# Altium footprint library DBLib.PcbLib: 92 footprints (part 4 of 6)
Each footprint in its own frame and in the unit in brackets; x right, y up, seen from the top. Pads: shape width x height; smd on the part's side, far side on the other; paste and mask are expansions set on the pad; w line width, h text height; cw(c..) or ccw(c..) is an arc to the next point about the centre after c.
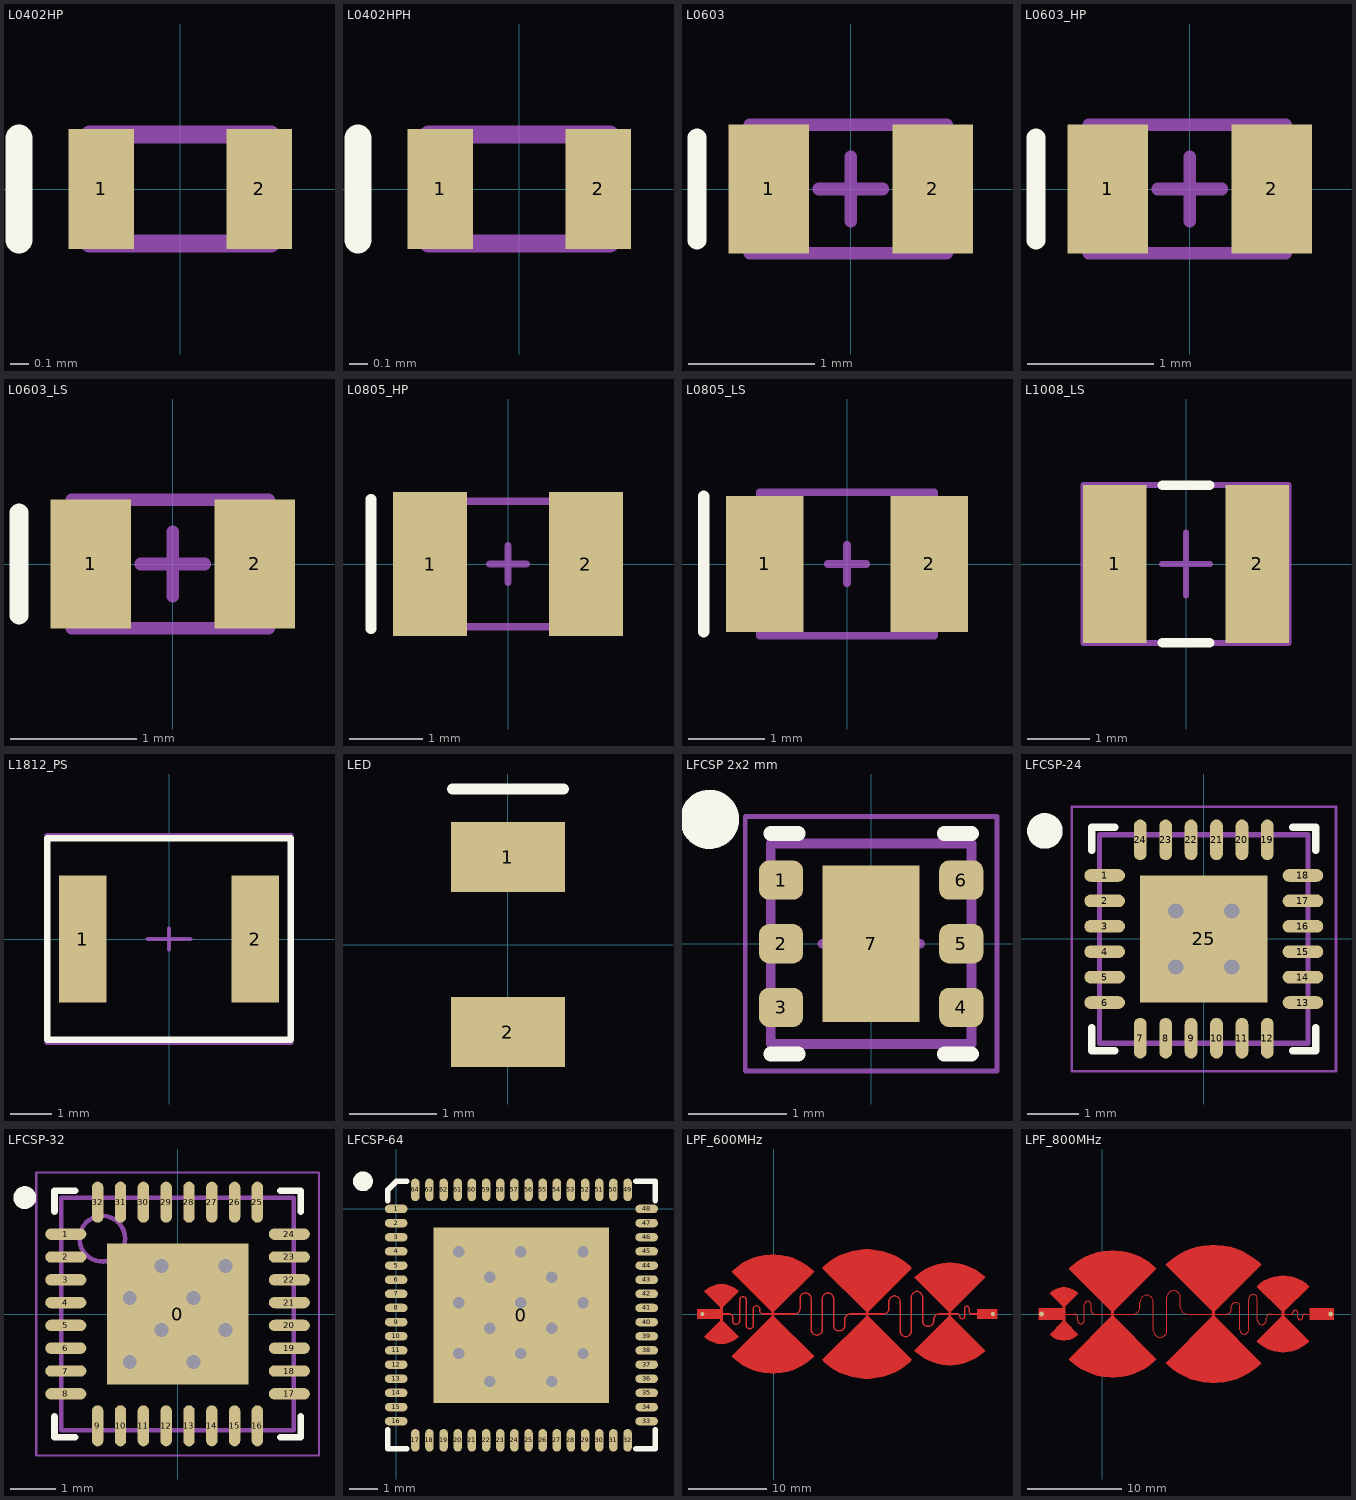
[diagram p3: the footprints below, top view; thin cyan lines are the x and y axes]

## L0402HP [mm]
height 1.3
pads (2):
  rect 0.36x0.66 smd: 1(-0.435,0) 2(0.435,0)
Top Overlay:
  lines w0.15: -0.889,-0.279 -0.889,0.279
Mechanical 1:
  lines w0.1: -0.5,-0.3 0.5,-0.3 0.5,0.3 -0.5,0.3 -0.5,-0.3
3D body "Ind_Coilcraft_0402HP-22NXGLU_eec.STEP": height 0.61, standoff 0, extent -0.546,-0.305 0.546,0.305

## L0402HPH [mm]
height 1.3
pads (2):
  rect 0.36x0.66 smd: 1(-0.435,0) 2(0.435,0)
Top Overlay:
  lines w0.15: -0.889,-0.279 -0.889,0.279
Mechanical 1:
  lines w0.1: -0.5,-0.3 -0.5,0.3 0.5,0.3 0.5,-0.3 -0.5,-0.3
3D body "Ind_Coilcraft_0402HPH-R10XJLU_eec.STEP": height 0.6, standoff -0.01, extent -0.56,-0.325 0.56,0.335

## L0603 [mm]
height 1.3
pads (2):
  rect 0.64x1.02 smd: 1(-0.65,0) 2(0.65,0)
Top Overlay:
  lines w0.15: -1.219,-0.406 -1.219,0.406
Mechanical 1:
  lines w0.1: -0.254,0 0.254,0 ; 0,-0.254 0,0.254 ; -0.8,-0.508 -0.8,0.508 0.762,0.508 0.762,-0.508 -0.8,-0.508
3D body "User Library-SLF_0603.step": height 1, standoff -0.02, extent -0.9,-0.56 0.9,0.56

## L0603_HP [mm]
height 1.3
pads (2):
  rect 0.64x1.02 smd: 1(-0.65,0) 2(0.65,0)
Top Overlay:
  lines w0.15: -1.219,-0.406 -1.219,0.406
Mechanical 1:
  lines w0.1: -0.254,0 0.254,0 ; 0,-0.254 0,0.254 ; -0.8,-0.508 -0.8,0.508 0.762,0.508 0.762,-0.508 -0.8,-0.508
3D body "Coilcraft-0603HP.step": height 0.93, standoff -0.01, extent -0.875,-0.545 0.875,0.545

## L0603_LS [mm]
height 1.3
pads (2):
  rect 0.64x1.02 smd: 1(-0.65,0) 2(0.65,0)
Top Overlay:
  lines w0.15: -1.219,-0.406 -1.219,0.406
Mechanical 1:
  lines w0.1: -0.254,0 0.254,0 ; 0,-0.254 0,0.254 ; -0.8,-0.508 0.762,-0.508 0.762,0.508 -0.8,0.508 -0.8,-0.508
3D body "Coilcraft-0603LS.step": height 1.11, standoff -0.01, extent -0.901,-0.584 0.901,0.585

## L0805_HP [mm]
height 1.3
pads (2):
  rect 1.02x1.98 smd: 1(-1.07,0) 2(1.07,0)
Top Overlay:
  lines w0.15: -1.88,-0.889 -1.88,0.889
Mechanical 1:
  lines w0.1: -0.254,0 0.254,0 ; 0,-0.254 0,0.254 ; -1.145,-0.862 -1.145,0.863 1.144,0.863 1.144,-0.862 -1.145,-0.862
3D body "Coilcraft-0805CS.step": height 1.51, standoff -0.01, extent -1.145,-0.862 1.144,0.863

## L0805_LS [mm]
height 1.3
pads (2):
  rect 1.02x1.78 smd: 1(-1.08,0) 2(1.08,0)
Top Overlay:
  lines w0.15: -1.88,-0.889 -1.88,0.889
Mechanical 1:
  lines w0.1: -0.254,0 0.254,0 ; 0,-0.254 0,0.254 ; -1.145,-0.94 -1.145,0.94 1.144,0.94 1.144,-0.94 -1.145,-0.94
3D body "Coilcraft-0805LS.step": height 1.59, standoff -0.01, extent -1.145,-0.955 1.145,0.955

## L1008_LS [mm]
height 1.3
pads (2):
  rect 1.02x2.54 smd: 1(-1.145,0) 2(1.145,0)
Top Overlay:
  lines w0.15: -0.381,-1.27 0.381,-1.27 ; -0.381,1.27 0.381,1.27
Mechanical 1:
  lines w0.1: -0.381,0 0.381,0 ; 0,-0.508 0,0.508 ; -1.651,-1.27 -1.651,1.27 1.651,1.27 1.651,-1.27 -1.651,-1.27
3D body "Coilcraft-1008LS.step": height 2.02, standoff -0.01, extent -1.46,-1.395 1.46,1.395

## L1812_PS [mm]
height 1.3
pads (2):
  rect 1.14x3.05 smd: 1(-2.07,0) 2(2.07,0)
Top Overlay:
  lines w0.15: -2.921,-2.413 -2.921,2.413 2.921,2.413 2.921,-2.413 -2.921,-2.413
Mechanical 1:
  lines w0.1: -0.508,0 0.508,0 ; 0,-0.254 0,0.254 ; -2.93,-2.49 -2.93,2.49 2.93,2.49 2.93,-2.49 -2.93,-2.49
3D body "Coilcraft-1812PS.step": height 3.8, standoff -0.01, extent -2.93,-2.49 2.93,2.49

## LED [mm] "2012"
pads (2):
  rect 1.3x0.8 smd: 1(0,1) 2(0,-1)
Top Overlay:
  lines w0.127: -0.635,1.778 0.635,1.778
3D body "APHCM2012.STEP": height 0.4, standoff -0.01, extent -0.625,-1 0.625,1

## LFCSP 2x2 mm [mm] "LFCSP, 6-Leads, Body 2,00x2,00mm, Pitch 0,65mm, Thermal Pad 1,60x0,99mm, IPC Medium Density"
height 0.9
pads (7):
  rrect50% 0.45x0.4 smd: 1(-0.92,0.65) 2(-0.92,0) 3(-0.92,-0.65) 4(0.92,-0.65) 5(0.92,0) 6(0.92,0.65)
  rect 0.99x1.6 smd: 7(0,0)
Top Overlay:
  circle w0.35: c-1.651,1.27 r0.127
  lines w0.15: -1.025,-1.125 -0.745,-1.125 ; -1.025,1.125 -0.745,1.125 ; 0.745,-1.125 1.025,-1.125 ; 0.745,1.125 1.025,1.125
Mechanical 1:
  lines w0.05: -1.285,-1.3 -1.285,1.3 1.285,1.3 1.285,-1.3 -1.285,-1.3
  lines w0.1: -0.5,0 0.5,0 ; 0,-0.5 0,0.5 ; -1.025,-1.025 -1.025,1.025 1.025,1.025 1.025,-1.025 -1.025,-1.025
3D body "User Library-LFCSP_UD6.step": height 0.65, standoff 0, extent -1.05,-1.005 1.05,0.995

## LFCSP-24 [mm] "QFN, 24-Leads, Body 4,00x4,00mm, Pitch 0,50mm, Thermal Pad 2,50x2,50mm, IPC Medium Density"
height 0.8
pads (25):
  oval 0.8x0.25 smd: 1(-1.95,1.25) 2(-1.95,0.75) 3(-1.95,0.25) 4(-1.95,-0.25) 5(-1.95,-0.75) 6(-1.95,-1.25) 13(1.95,-1.25) 14(1.95,-0.75) 15(1.95,-0.25) 16(1.95,0.25) 17(1.95,0.75) 18(1.95,1.25)
  oval 0.25x0.8 smd: 7(-1.25,-1.95) 8(-0.75,-1.95) 9(-0.25,-1.95) 10(0.25,-1.95) 11(0.75,-1.95) 12(1.25,-1.95) 19(1.25,1.95) 20(0.75,1.95) 21(0.25,1.95) 22(-0.25,1.95) 23(-0.75,1.95) 24(-1.25,1.95)
  rect 2.5x2.5 all layers, no hole: 25(0,0)
via -0.55,0.55 diameter 0.6 hole 0.3
via 0.55,0.55 diameter 0.6 hole 0.3
via 0.55,-0.55 diameter 0.6 hole 0.3
via -0.55,-0.55 diameter 0.6 hole 0.3
Top Overlay:
  circle w0.35: c-3.125,2.125 r0.175
  lines w0.15: -2.2,-1.75 -2.2,-2.2 -1.75,-2.2 ; -2.2,1.75 -2.2,2.2 -1.75,2.2 ; 1.75,-2.2 2.2,-2.2 2.2,-1.75 ; 1.75,2.2 2.2,2.2 2.2,1.75
Mechanical 1:
  lines w0.05: -2.6,-2.6 -2.6,2.6 2.6,2.6 2.6,-2.6 -2.6,-2.6
  lines w0.1: -2.05,-2.05 -2.05,2.05 2.05,2.05 2.05,-2.05 -2.05,-2.05
Mechanical 15:
  lines w0.1: -0.5,0 0.5,0 ; 0,-0.5 0,0.5
3D body "User Library-LFCSP-24.step": height 0.83, standoff -0.02, extent -1.99,-2.01 2.01,1.99

## LFCSP-32 [mm] "LFCSP, 32-Leads, Body 5,00x5,00mm, Pitch 0,50mm"
height 1.35
pads (33):
  rect 3.1x3.1 all layers, no hole: 0(0,0)
  oval 0.9x0.25 smd: 1(-2.45,1.75) 2(-2.45,1.25) 3(-2.45,0.75) 4(-2.45,0.25) 5(-2.45,-0.25) 6(-2.45,-0.75) 7(-2.45,-1.25) 8(-2.45,-1.75) 17(2.45,-1.75) 18(2.45,-1.25) 19(2.45,-0.75) 20(2.45,-0.25) 21(2.45,0.25) 22(2.45,0.75) 23(2.45,1.25) 24(2.45,1.75)
  oval 0.25x0.9 smd: 9(-1.75,-2.45) 10(-1.25,-2.45) 11(-0.75,-2.45) 12(-0.25,-2.45) 13(0.25,-2.45) 14(0.75,-2.45) 15(1.25,-2.45) 16(1.75,-2.45) 25(1.75,2.45) 26(1.25,2.45) 27(0.75,2.45) 28(0.25,2.45) 29(-0.25,2.45) 30(-0.75,2.45) 31(-1.25,2.45) 32(-1.75,2.45)
via -1.05,0.35 diameter 0.6 hole 0.3
via 0.35,-1.05 diameter 0.6 hole 0.3
via 1.05,-0.35 diameter 0.6 hole 0.3
via -0.35,-0.35 diameter 0.6 hole 0.3
via 0.35,0.35 diameter 0.6 hole 0.3
via 1.05,1.05 diameter 0.6 hole 0.3
via -0.35,1.05 diameter 0.6 hole 0.3
via -1.05,-1.05 diameter 0.6 hole 0.3
Top Overlay:
  circle w0.25: c-3.35,2.55 r0.125
  lines w0.15: -2.7,-2.25 -2.7,-2.7 -2.25,-2.7 ; -2.7,2.25 -2.7,2.7 -2.25,2.7 ; 2.25,-2.7 2.7,-2.7 2.7,-2.25 ; 2.25,2.7 2.7,2.7 2.7,2.25
Mechanical 1:
  circle w0.1: c-1.65,1.65 r0.5
  lines w0.05: -3.1,-3.1 -3.1,3.1 3.1,3.1 3.1,-3.1 -3.1,-3.1
  lines w0.1: -0.5,0 0.5,0 ; 0,-0.5 0,0.5 ; -2.55,-2.55 -2.55,2.55 2.55,2.55 2.55,-2.55 -2.55,-2.55

## LFCSP-64 [mm]
height 1
pads (65):
  rect 6.2x6.2 all layers, no hole: 0(4.425,-3.75)
  oval 0.8x0.3 smd: 1(0,0) 2(0,-0.5) 3(0,-1) 4(0,-1.5) 5(0,-2) 6(0,-2.5) 7(0,-3) 8(0,-3.5) 9(0,-4) 10(0,-4.5) 11(0,-5) 12(0,-5.5) 13(0,-6) 14(0,-6.5) 15(0,-7) 16(0,-7.5) 33(8.85,-7.5) 34(8.85,-7) 35(8.85,-6.5) 36(8.85,-6) 37(8.85,-5.5) 38(8.85,-5) 39(8.85,-4.5) 40(8.85,-4) 41(8.85,-3.5) 42(8.85,-3) 43(8.85,-2.5) 44(8.85,-2) 45(8.85,-1.5) 46(8.85,-1) 47(8.85,-0.5) 48(8.85,0)
  oval 0.3x0.8 smd: 17(0.675,-8.175) 18(1.175,-8.175) 19(1.675,-8.175) 20(2.175,-8.175) 21(2.675,-8.175) 22(3.175,-8.175) 23(3.675,-8.175) 24(4.175,-8.175) 25(4.675,-8.175) 26(5.175,-8.175) 27(5.675,-8.175) 28(6.175,-8.175) 29(6.675,-8.175) 30(7.175,-8.175) 31(7.675,-8.175) 32(8.175,-8.175) 49(8.175,0.675) 50(7.675,0.675) 51(7.175,0.675) 52(6.675,0.675) 53(6.175,0.675) 54(5.675,0.675) 55(5.175,0.675) 56(4.675,0.675) 57(4.175,0.675) 58(3.675,0.675) 59(3.175,0.675) 60(2.675,0.675) 61(2.175,0.675) 62(1.675,0.675) 63(1.175,0.675) 64(0.675,0.675)
via 2.211,-5.111 diameter 0.7 hole 0.4
via 4.4,-1.511 diameter 0.7 hole 0.4
via 6.6,-1.511 diameter 0.7 hole 0.4
via 3.3,-2.411 diameter 0.7 hole 0.4
via 5.5,-2.411 diameter 0.7 hole 0.4
via 4.4,-3.311 diameter 0.7 hole 0.4
via 6.6,-3.311 diameter 0.7 hole 0.4
via 3.3,-4.211 diameter 0.7 hole 0.4
via 5.5,-4.211 diameter 0.7 hole 0.4
via 4.4,-5.111 diameter 0.7 hole 0.4
via 6.6,-5.111 diameter 0.7 hole 0.4
via 2.211,-3.311 diameter 0.7 hole 0.4
via 2.211,-1.511 diameter 0.7 hole 0.4
via 5.5,-6.1 diameter 0.7 hole 0.4
via 3.3,-6.1 diameter 0.7 hole 0.4
Top Overlay:
  circle w0.35: c-1.175,0.975 r0.175
  lines w0.2: -0.3,-7.8 -0.3,-8.475 0.375,-8.475 ; -0.3,0.3 -0.3,0.675 0,0.975 0.375,0.975 ; 8.475,-8.475 9.15,-8.475 9.15,-7.8 ; 8.475,0.975 9.15,0.975 9.15,0.3
Top Paste:
  rectangle: 4.6,-6.5 7.1,-3.9
  rectangle: 4.6,-3.6 7.1,-1
  rectangle: 1.7,-3.6 4.3,-1
  rectangle: 1.7,-6.5 4.3,-3.9
3D body "User Library-LFCSP-64 AD9984AKCPZ-170.step": height 0.82, standoff -0.05, extent -0.075,-8.25 8.925,0.75

## LPF_600MHz [mm] "stripline LPF"
pads (2):
  round 0.5 smd: IN(-9.144,0) OUT(27.94,0)
Top Layer:
  region: 24.009,-0.677 23.934,-0.677 23.795,-0.62 23.689,-0.514 23.631,-0.375 23.631,-0.3 23.627,-0.254 23.592,-0.169 23.526,-0.104 23.441,-0.068 23.395,-0.064 22.597,-0.064 22.571,-0.064 22.534,-0.026 22.534,0.026 22.571,0.064 22.597,0.064 23.395,0.064 23.468,0.064 23.601,0.009 23.704,-0.094 23.759,-0.228 23.759,-0.3 23.764,-0.349 23.801,-0.439 23.87,-0.507 23.96,-0.545 24.009,-0.549 24.057,-0.545 24.147,-0.507 24.216,-0.439 24.254,-0.349 24.258,-0.3 24.258,0.658 24.258,0.733 24.316,0.871 24.422,0.978 24.561,1.035 24.636,1.035 24.711,1.035 24.849,0.978 24.956,0.871 25.013,0.733 25.013,0.658 25.013,0.313 25.018,0.265 25.055,0.175 25.124,0.106 25.214,0.069 25.263,0.064 25.93,0.064 25.942,0.064 25.966,0.054 25.984,0.036 25.994,0.013 25.994,0 25.994,-0.013 25.984,-0.036 25.966,-0.054 25.942,-0.064 25.93,-0.064 25.263,-0.064 25.188,-0.064 25.049,-0.006 24.943,0.1 24.885,0.238 24.885,0.313 24.885,0.658 24.881,0.706 24.843,0.796 24.774,0.865 24.684,0.903 24.636,0.907 24.587,0.903 24.497,0.865 24.428,0.796 24.391,0.706 24.386,0.658 24.386,-0.3 24.386,-0.375 24.329,-0.514 24.222,-0.62 24.084,-0.677
  region: 151 vertices and 0 holes, not listed, extent -6.629,-1.964 -0.204,2.262
  region: 191 vertices and 0 holes, not listed, extent 11.955,-2.954 22.394,2.954
  region: 191 vertices and 0 holes, not listed, extent -0.064,-2.757 11.815,2.757
  region: 11.758,-0.27 11.757,-0.27 11.754,-0.269 11.752,-0.267 11.751,-0.265 11.751,-0.263 11.751,0.263 11.751,0.265 11.752,0.267 11.754,0.269 11.757,0.27 11.758,0.27 12.012,0.27 12.013,0.27 12.016,0.269 12.018,0.267 12.019,0.265 12.019,0.263 12.019,-0.263 12.019,-0.265 12.018,-0.267 12.016,-0.269 12.013,-0.27 12.012,-0.27
  region: -0.261,-0.27 -0.262,-0.27 -0.265,-0.269 -0.266,-0.267 -0.267,-0.265 -0.267,-0.263 -0.267,0.263 -0.267,0.265 -0.266,0.267 -0.265,0.269 -0.262,0.27 -0.261,0.27 -0.007,0.27 -0.005,0.27 -0.003,0.269 -0.001,0.267 0,0.265 0,0.263 0,-0.263 0,-0.265 -0.001,-0.267 -0.003,-0.269 -0.005,-0.27 -0.007,-0.27
  region: -6.826,-0.797 -6.827,-0.797 -6.83,-0.796 -6.831,-0.794 -6.833,-0.792 -6.833,-0.79 -6.833,0.79 -6.833,0.792 -6.831,0.794 -6.83,0.796 -6.827,0.797 -6.826,0.797 -6.572,0.797 -6.57,0.797 -6.568,0.796 -6.566,0.794 -6.565,0.792 -6.565,0.79 -6.565,-0.79 -6.565,-0.792 -6.566,-0.794 -6.568,-0.796 -6.57,-0.797 -6.572,-0.797
  region: 22.337,-0.27 22.335,-0.27 22.333,-0.269 22.331,-0.267 22.33,-0.265 22.33,-0.263 22.33,0.263 22.33,0.265 22.331,0.267 22.333,0.269 22.335,0.27 22.337,0.27 22.591,0.27 22.592,0.27 22.595,0.269 22.596,0.267 22.597,0.265 22.597,0.263 22.597,-0.263 22.597,-0.265 22.596,-0.267 22.595,-0.269 22.592,-0.27 22.591,-0.27
  region: -0.261,0.263 -5.395,5.397 -5.136,5.656 -4.571,6.12 -3.963,6.526 -3.319,6.87 -2.643,7.15 -1.944,7.362 -1.227,7.505 -0.499,7.577 -0.134,7.577 0.232,7.577 0.959,7.505 1.676,7.362 2.376,7.15 3.051,6.87 3.696,6.526 4.304,6.12 4.869,5.656 5.127,5.397 -0.007,0.263
  region: -5.395,-5.397 -5.136,-5.656 -4.571,-6.12 -3.963,-6.526 -3.319,-6.87 -2.643,-7.15 -1.944,-7.362 -1.227,-7.505 -0.499,-7.577 -0.134,-7.577 0.232,-7.577 0.959,-7.505 1.676,-7.362 2.376,-7.15 3.051,-6.87 3.696,-6.526 4.304,-6.12 4.869,-5.656 5.127,-5.397 -0.007,-0.263 -0.261,-0.263
  region: -6.826,0.79 -8.917,2.882 -8.808,2.991 -8.57,3.187 -8.314,3.358 -8.042,3.503 -7.757,3.621 -7.462,3.711 -7.16,3.771 -6.853,3.801 -6.699,3.801 -6.545,3.801 -6.238,3.771 -5.936,3.711 -5.641,3.621 -5.356,3.503 -5.084,3.358 -4.827,3.187 -4.589,2.991 -4.48,2.882 -6.572,0.79
  region: -8.917,-2.882 -8.808,-2.991 -8.57,-3.187 -8.314,-3.358 -8.042,-3.503 -7.757,-3.621 -7.462,-3.711 -7.16,-3.771 -6.853,-3.801 -6.699,-3.801 -6.545,-3.801 -6.238,-3.771 -5.936,-3.711 -5.641,-3.621 -5.356,-3.503 -5.084,-3.358 -4.827,-3.187 -4.589,-2.991 -4.48,-2.882 -6.572,-0.79 -6.826,-0.79
  region: 11.758,0.263 6.151,5.871 6.432,6.152 7.048,6.658 7.711,7.1 8.414,7.476 9.15,7.781 9.912,8.012 10.694,8.168 11.487,8.246 11.885,8.246 12.283,8.246 13.076,8.168 13.858,8.012 14.62,7.781 15.356,7.476 16.059,7.1 16.721,6.658 17.337,6.152 17.619,5.871 12.012,0.263
  region: 6.151,-5.871 6.432,-6.152 7.048,-6.658 7.711,-7.1 8.414,-7.476 9.15,-7.781 9.912,-8.012 10.694,-8.168 11.487,-8.246 11.885,-8.246 12.283,-8.246 13.076,-8.168 13.858,-8.012 14.62,-7.781 15.356,-7.476 16.059,-7.1 16.721,-6.658 17.337,-6.152 17.619,-5.871 12.012,-0.263 11.758,-0.263
  region: 17.937,-4.663 18.16,-4.885 18.646,-5.284 19.169,-5.634 19.724,-5.93 20.305,-6.171 20.906,-6.353 21.523,-6.476 22.149,-6.538 22.464,-6.538 22.778,-6.538 23.404,-6.476 24.021,-6.353 24.623,-6.171 25.204,-5.93 25.759,-5.634 26.282,-5.284 26.768,-4.885 26.99,-4.663 22.591,-0.263 22.337,-0.263
  region: 22.337,0.263 17.937,4.663 18.16,4.885 18.646,5.284 19.169,5.634 19.724,5.93 20.305,6.171 20.906,6.353 21.523,6.476 22.149,6.538 22.464,6.538 22.778,6.538 23.404,6.476 24.021,6.353 24.623,6.171 25.204,5.93 25.759,5.634 26.282,5.284 26.768,4.885 26.99,4.663 22.591,0.263
  region: -9.826,-0.59 -6.826,-0.59 -6.826,0.59 -9.826,0.59
  region: 25.93,-0.59 25.93,0.59 28.47,0.59 28.47,-0.59
Top Solder:
  region: -8.89,8.89 27.305,8.89 27.431,8.89 27.665,8.793 27.843,8.615 27.94,8.381 27.94,8.255 27.94,-8.255 27.94,-8.381 27.843,-8.615 27.665,-8.793 27.431,-8.89 27.305,-8.89 -8.89,-8.89 -9.016,-8.89 -9.25,-8.793 -9.428,-8.615 -9.525,-8.381 -9.525,-8.255 -9.525,8.255 -9.525,8.381 -9.428,8.615 -9.25,8.793 -9.016,8.89

## LPF_800MHz [mm] "stripline LPF"
pads (2):
  round 0.5 smd: IN(-6.4,0) OUT(24.2,0)
Top Layer:
  region: 0.995,0.268 -3.524,4.787 -3.296,5.015 -2.797,5.425 -2.26,5.783 -1.691,6.088 -1.094,6.335 -0.476,6.522 0.157,6.648 0.799,6.711 1.122,6.711 1.445,6.711 2.087,6.648 2.72,6.522 3.338,6.335 3.934,6.088 4.504,5.783 5.04,5.425 5.539,5.015 5.767,4.787 1.249,0.268
  region: -5.543,-2.17 -5.394,-2.319 -5.044,-2.552 -4.655,-2.714 -4.242,-2.796 -4.032,-2.796 -3.822,-2.796 -3.409,-2.714 -3.02,-2.552 -2.67,-2.319 -2.521,-2.17 -3.905,-0.786 -4.159,-0.786
  region: -4.159,0.795 -5.543,2.18 -5.394,2.328 -5.044,2.562 -4.655,2.723 -4.242,2.806 -4.032,2.806 -3.822,2.806 -3.409,2.723 -3.02,2.562 -2.67,2.328 -2.521,2.18 -3.905,0.795
  region: -4.159,-0.786 -3.905,-0.786 -3.905,0.795 -4.159,0.795
  region: -6.699,-0.586 -6.699,0.595 -4.159,0.595 -4.159,-0.586
  region: 0.995,-0.259 0.995,0.268 1.249,0.268 1.249,-0.259
  region: -3.524,-4.777 -3.296,-5.005 -2.797,-5.415 -2.26,-5.774 -1.691,-6.078 -1.094,-6.325 -0.476,-6.512 0.157,-6.638 0.799,-6.702 1.122,-6.702 1.445,-6.702 2.087,-6.638 2.72,-6.512 3.338,-6.325 3.934,-6.078 4.504,-5.774 5.04,-5.415 5.539,-5.005 5.767,-4.777 1.249,-0.259 0.995,-0.259
  region: 6.756,5.203 11.69,0.268 11.944,0.268 16.879,5.203 16.63,5.452 16.086,5.898 15.502,6.288 14.881,6.62 14.232,6.889 13.559,7.093 12.869,7.23 12.169,7.299 11.817,7.299 11.466,7.299 10.766,7.23 10.076,7.093 9.403,6.889 8.753,6.62 8.133,6.288 7.548,5.898 7.004,5.452
  region: 11.69,-0.259 11.944,-0.259 11.944,0.268 11.69,0.268
  region: 6.756,-5.193 7.004,-5.442 7.548,-5.888 8.133,-6.279 8.753,-6.61 9.403,-6.879 10.076,-7.083 10.766,-7.221 11.466,-7.29 11.817,-7.29 12.169,-7.29 12.869,-7.221 13.559,-7.083 14.232,-6.879 14.881,-6.61 15.502,-6.279 16.086,-5.888 16.63,-5.442 16.879,-5.193 11.944,-0.259 11.69,-0.259
  region: 16.393,2.906 19.03,0.268 19.284,0.268 21.922,2.906 21.786,3.042 21.489,3.286 21.17,3.499 20.831,3.68 20.476,3.827 20.109,3.939 19.732,4.014 19.349,4.051 19.157,4.051 18.965,4.051 18.583,4.014 18.206,3.939 17.839,3.827 17.484,3.68 17.145,3.499 16.825,3.286 16.528,3.042
  region: 19.03,-0.259 19.284,-0.259 19.284,0.268 19.03,0.268
  region: 16.393,-2.896 16.528,-3.032 16.825,-3.276 17.145,-3.489 17.484,-3.67 17.839,-3.818 18.206,-3.929 18.583,-4.004 18.965,-4.042 19.157,-4.042 19.349,-4.042 19.732,-4.004 20.109,-3.929 20.476,-3.818 20.831,-3.67 21.17,-3.489 21.489,-3.276 21.786,-3.032 21.922,-2.896 19.284,-0.259 19.03,-0.259
  region: 21.992,-0.586 24.532,-0.586 24.532,0.595 21.992,0.595
  lines w0.013: -3.905,-0.059 -3.905,0.068 ; 0.995,-0.059 0.995,0.068 ; 1.249,-0.059 1.249,0.068 ; 11.69,-0.059 11.69,0.068 ; 11.944,-0.059 11.944,0.068
  lines w0.127: -3.912,0 -3.683,0 -3.32,0 -2.956,0 cw(c-2.956,-0.363) -2.593,-0.363 -2.593,-0.674 ccw(c-2.229,-0.674) -2.229,-1.038 ccw(c-2.229,-0.674) -1.866,-0.674 -1.866,0 -1.866,0.978 cw(c-1.502,0.978) -1.502,1.342 cw(c-1.502,0.978) -1.139,0.978 -1.139,0.363 ccw(c-0.775,0.363) -0.775,0 0,0 0.991,0 ; 1.245,0 3.302,0 ccw(c3.302,0.713) 4.015,0.713 4.015,1.254 cw(c4.729,1.254) 4.729,1.968 cw(c4.729,1.254) 5.442,1.254 5.442,0 5.442,-1.749 ccw(c6.156,-1.749) 6.156,-2.462 ccw(c6.156,-1.749) 6.869,-1.749 6.869,0 6.869,1.749 cw(c7.583,1.749) 7.583,2.462 cw(c7.583,1.749) 8.296,1.749 8.296,0.713 ccw(c9.01,0.713) 9.01,0 10.287,0 11.69,0 ; 11.944,0 13.208,0 ccw(c13.208,0.463) 13.671,0.463 13.671,0.743 cw(c14.135,0.743) 14.135,1.206 cw(c14.135,0.743) 14.598,0.743 14.598,0 14.598,-1.66 ccw(c15.062,-1.66) 15.062,-2.123 ccw(c15.062,-1.66) 15.525,-1.66 15.525,0 15.525,1.593 cw(c15.989,1.593) 15.989,2.057 cw(c15.989,1.593) 16.452,1.593 16.452,0 16.452,-0.657 ccw(c16.916,-0.657) 16.916,-1.12 ccw(c16.916,-0.657) 17.379,-0.657 17.379,-0.463 cw(c17.843,-0.463) 17.843,0 18.288,0 19.03,0 ; 19.284,0 19.939,0 20.072,0 ccw(c20.072,0.13) 20.202,0.13 cw(c20.466,0.13) 20.466,0.394 cw(c20.466,0.13) 20.729,0.13 20.729,0 20.729,-0.337 ccw(c20.993,-0.337) 20.993,-0.601 ccw(c20.993,-0.337) 21.256,-0.337 21.256,-0.263 cw(c21.52,-0.263) 21.52,0 21.692,0 21.996,0
Top Solder:
  region: -6.35,8.255 24.13,8.255 24.256,8.255 24.49,8.158 24.668,7.98 24.765,7.746 24.765,7.62 24.765,-7.62 24.765,-7.746 24.668,-7.98 24.49,-8.158 24.256,-8.255 24.13,-8.255 -6.35,-8.255 -6.476,-8.255 -6.71,-8.158 -6.888,-7.98 -6.985,-7.746 -6.985,-7.62 -6.985,7.62 -6.985,7.746 -6.888,7.98 -6.71,8.158 -6.476,8.255